# Altium footprint library ref-packages.PCBLIB: 1544 footprints (part 79 of 103)
Each footprint in its own frame and in the unit in brackets; x right, y up, seen from the top. Pads: shape width x height; smd on the part's side, far side on the other; paste and mask are expansions set on the pad; w line width, h text height; cw(c..) or ccw(c..) is an arc to the next point about the centre after c.
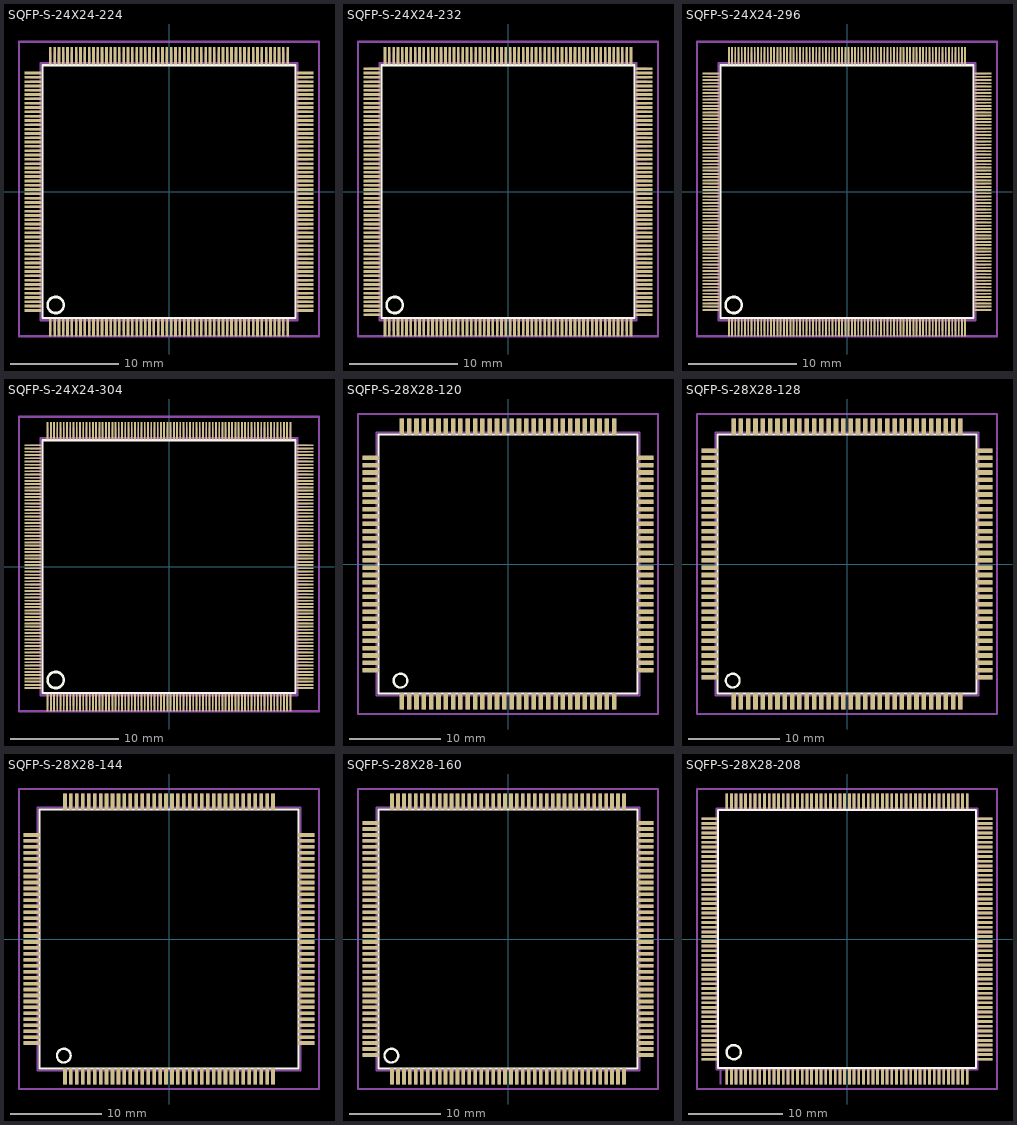
[diagram p78: the footprints below, top view; thin cyan lines are the x and y axes]

## SQFP-S-24X24-224 [mm]
pads (224):
  rect 0.25x1.6 smd: 1(-11,-12.6) 2(-10.6,-12.6) 3(-10.2,-12.6) 4(-9.8,-12.6) 5(-9.4,-12.6) 6(-9,-12.6) 7(-8.6,-12.6) 8(-8.2,-12.6) 9(-7.8,-12.6) 10(-7.4,-12.6) 11(-7,-12.6) 12(-6.6,-12.6) 13(-6.2,-12.6) 14(-5.8,-12.6) 15(-5.4,-12.6) 16(-5,-12.6) 17(-4.6,-12.6) 18(-4.2,-12.6) 19(-3.8,-12.6) 20(-3.4,-12.6) 21(-3,-12.6) 22(-2.6,-12.6) 23(-2.2,-12.6) 24(-1.8,-12.6) 25(-1.4,-12.6) 26(-1,-12.6) 27(-0.6,-12.6) 28(-0.2,-12.6) 29(0.2,-12.6) 30(0.6,-12.6) 31(1,-12.6) 32(1.4,-12.6) 33(1.8,-12.6) 34(2.2,-12.6) 35(2.6,-12.6) 36(3,-12.6) 37(3.4,-12.6) 38(3.8,-12.6) 39(4.2,-12.6) 40(4.6,-12.6) 41(5,-12.6) 42(5.4,-12.6) 43(5.8,-12.6) 44(6.2,-12.6) 45(6.6,-12.6) 46(7,-12.6) 47(7.4,-12.6) 48(7.8,-12.6) 49(8.2,-12.6) 50(8.6,-12.6) 51(9,-12.6) 52(9.4,-12.6) 53(9.8,-12.6) 54(10.2,-12.6) 55(10.6,-12.6) 56(11,-12.6) 113(11,12.6) 114(10.6,12.6) 115(10.2,12.6) 116(9.8,12.6) 117(9.4,12.6) 118(9,12.6) 119(8.6,12.6) 120(8.2,12.6) 121(7.8,12.6) 122(7.4,12.6) 123(7,12.6) 124(6.6,12.6) 125(6.2,12.6) 126(5.8,12.6) 127(5.4,12.6) 128(5,12.6) 129(4.6,12.6) 130(4.2,12.6) 131(3.8,12.6) 132(3.4,12.6) 133(3,12.6) 134(2.6,12.6) 135(2.2,12.6) 136(1.8,12.6) 137(1.4,12.6) 138(1,12.6) 139(0.6,12.6) 140(0.2,12.6) 141(-0.2,12.6) 142(-0.6,12.6) 143(-1,12.6) 144(-1.4,12.6) 145(-1.8,12.6) 146(-2.2,12.6) 147(-2.6,12.6) 148(-3,12.6) 149(-3.4,12.6) 150(-3.8,12.6) 151(-4.2,12.6) 152(-4.6,12.6) 153(-5,12.6) 154(-5.4,12.6) 155(-5.8,12.6) 156(-6.2,12.6) 157(-6.6,12.6) 158(-7,12.6) 159(-7.4,12.6) 160(-7.8,12.6) 161(-8.2,12.6) 162(-8.6,12.6) 163(-9,12.6) 164(-9.4,12.6) 165(-9.8,12.6) 166(-10.2,12.6) 167(-10.6,12.6) 168(-11,12.6)
  rect 1.6x0.25 smd: 57(12.6,-11) 58(12.6,-10.6) 59(12.6,-10.2) 60(12.6,-9.8) 61(12.6,-9.4) 62(12.6,-9) 63(12.6,-8.6) 64(12.6,-8.2) 65(12.6,-7.8) 66(12.6,-7.4) 67(12.6,-7) 68(12.6,-6.6) 69(12.6,-6.2) 70(12.6,-5.8) 71(12.6,-5.4) 72(12.6,-5) 73(12.6,-4.6) 74(12.6,-4.2) 75(12.6,-3.8) 76(12.6,-3.4) 77(12.6,-3) 78(12.6,-2.6) 79(12.6,-2.2) 80(12.6,-1.8) 81(12.6,-1.4) 82(12.6,-1) 83(12.6,-0.6) 84(12.6,-0.2) 85(12.6,0.2) 86(12.6,0.6) 87(12.6,1) 88(12.6,1.4) 89(12.6,1.8) 90(12.6,2.2) 91(12.6,2.6) 92(12.6,3) 93(12.6,3.4) 94(12.6,3.8) 95(12.6,4.2) 96(12.6,4.6) 97(12.6,5) 98(12.6,5.4) 99(12.6,5.8) 100(12.6,6.2) 101(12.6,6.6) 102(12.6,7) 103(12.6,7.4) 104(12.6,7.8) 105(12.6,8.2) 106(12.6,8.6) 107(12.6,9) 108(12.6,9.4) 109(12.6,9.8) 110(12.6,10.2) 111(12.6,10.6) 112(12.6,11) 169(-12.6,11) 170(-12.6,10.6) 171(-12.6,10.2) 172(-12.6,9.8) 173(-12.6,9.4) 174(-12.6,9) 175(-12.6,8.6) 176(-12.6,8.2) 177(-12.6,7.8) 178(-12.6,7.4) 179(-12.6,7) 180(-12.6,6.6) 181(-12.6,6.2) 182(-12.6,5.8) 183(-12.6,5.4) 184(-12.6,5) 185(-12.6,4.6) 186(-12.6,4.2) 187(-12.6,3.8) 188(-12.6,3.4) 189(-12.6,3) 190(-12.6,2.6) 191(-12.6,2.2) 192(-12.6,1.8) 193(-12.6,1.4) 194(-12.6,1) 195(-12.6,0.6) 196(-12.6,0.2) 197(-12.6,-0.2) 198(-12.6,-0.6) 199(-12.6,-1) 200(-12.6,-1.4) 201(-12.6,-1.8) 202(-12.6,-2.2) 203(-12.6,-2.6) 204(-12.6,-3) 205(-12.6,-3.4) 206(-12.6,-3.8) 207(-12.6,-4.2) 208(-12.6,-4.6) 209(-12.6,-5) 210(-12.6,-5.4) 211(-12.6,-5.8) 212(-12.6,-6.2) 213(-12.6,-6.6) 214(-12.6,-7) 215(-12.6,-7.4) 216(-12.6,-7.8) 217(-12.6,-8.2) 218(-12.6,-8.6) 219(-12.6,-9) 220(-12.6,-9.4) 221(-12.6,-9.8) 222(-12.6,-10.2) 223(-12.6,-10.6) 224(-12.6,-11)
Top Overlay:
  circle w0.254: c-10.5,-10.5 r0.75
  lines w0.203: -11.72,-11.71 11.71,-11.71 11.71,11.71 -11.72,11.71 -11.72,-11.71
Mechanical 16:
  drawing of 228 lines, arcs and shapes, not listed
Mechanical 27:
  lines w0.2: -13.9,-13.4 -13.9,13.9 13.9,13.9 13.9,-13.4 -13.9,-13.4

## SQFP-S-24X24-232 [mm]
pads (232):
  rect 0.25x1.6 smd: 1(-11.4,-12.6) 2(-11,-12.6) 3(-10.6,-12.6) 4(-10.2,-12.6) 5(-9.8,-12.6) 6(-9.4,-12.6) 7(-9,-12.6) 8(-8.6,-12.6) 9(-8.2,-12.6) 10(-7.8,-12.6) 11(-7.4,-12.6) 12(-7,-12.6) 13(-6.6,-12.6) 14(-6.2,-12.6) 15(-5.8,-12.6) 16(-5.4,-12.6) 17(-5,-12.6) 18(-4.6,-12.6) 19(-4.2,-12.6) 20(-3.8,-12.6) 21(-3.4,-12.6) 22(-3,-12.6) 23(-2.6,-12.6) 24(-2.2,-12.6) 25(-1.8,-12.6) 26(-1.4,-12.6) 27(-1,-12.6) 28(-0.6,-12.6) 29(-0.2,-12.6) 30(0.2,-12.6) 31(0.6,-12.6) 32(1,-12.6) 33(1.4,-12.6) 34(1.8,-12.6) 35(2.2,-12.6) 36(2.6,-12.6) 37(3,-12.6) 38(3.4,-12.6) 39(3.8,-12.6) 40(4.2,-12.6) 41(4.6,-12.6) 42(5,-12.6) 43(5.4,-12.6) 44(5.8,-12.6) 45(6.2,-12.6) 46(6.6,-12.6) 47(7,-12.6) 48(7.4,-12.6) 49(7.8,-12.6) 50(8.2,-12.6) 51(8.6,-12.6) 52(9,-12.6) 53(9.4,-12.6) 54(9.8,-12.6) 55(10.2,-12.6) 56(10.6,-12.6) 57(11,-12.6) 58(11.4,-12.6) 117(11.4,12.6) 118(11,12.6) 119(10.6,12.6) 120(10.2,12.6) 121(9.8,12.6) 122(9.4,12.6) 123(9,12.6) 124(8.6,12.6) 125(8.2,12.6) 126(7.8,12.6) 127(7.4,12.6) 128(7,12.6) 129(6.6,12.6) 130(6.2,12.6) 131(5.8,12.6) 132(5.4,12.6) 133(5,12.6) 134(4.6,12.6) 135(4.2,12.6) 136(3.8,12.6) 137(3.4,12.6) 138(3,12.6) 139(2.6,12.6) 140(2.2,12.6) 141(1.8,12.6) 142(1.4,12.6) 143(1,12.6) 144(0.6,12.6) 145(0.2,12.6) 146(-0.2,12.6) 147(-0.6,12.6) 148(-1,12.6) 149(-1.4,12.6) 150(-1.8,12.6) 151(-2.2,12.6) 152(-2.6,12.6) 153(-3,12.6) 154(-3.4,12.6) 155(-3.8,12.6) 156(-4.2,12.6) 157(-4.6,12.6) 158(-5,12.6) 159(-5.4,12.6) 160(-5.8,12.6) 161(-6.2,12.6) 162(-6.6,12.6) 163(-7,12.6) 164(-7.4,12.6) 165(-7.8,12.6) 166(-8.2,12.6) 167(-8.6,12.6) 168(-9,12.6) 169(-9.4,12.6) 170(-9.8,12.6) 171(-10.2,12.6) 172(-10.6,12.6) 173(-11,12.6) 174(-11.4,12.6)
  rect 1.6x0.25 smd: 59(12.6,-11.4) 60(12.6,-11) 61(12.6,-10.6) 62(12.6,-10.2) 63(12.6,-9.8) 64(12.6,-9.4) 65(12.6,-9) 66(12.6,-8.6) 67(12.6,-8.2) 68(12.6,-7.8) 69(12.6,-7.4) 70(12.6,-7) 71(12.6,-6.6) 72(12.6,-6.2) 73(12.6,-5.8) 74(12.6,-5.4) 75(12.6,-5) 76(12.6,-4.6) 77(12.6,-4.2) 78(12.6,-3.8) 79(12.6,-3.4) 80(12.6,-3) 81(12.6,-2.6) 82(12.6,-2.2) 83(12.6,-1.8) 84(12.6,-1.4) 85(12.6,-1) 86(12.6,-0.6) 87(12.6,-0.2) 88(12.6,0.2) 89(12.6,0.6) 90(12.6,1) 91(12.6,1.4) 92(12.6,1.8) 93(12.6,2.2) 94(12.6,2.6) 95(12.6,3) 96(12.6,3.4) 97(12.6,3.8) 98(12.6,4.2) 99(12.6,4.6) 100(12.6,5) 101(12.6,5.4) 102(12.6,5.8) 103(12.6,6.2) 104(12.6,6.6) 105(12.6,7) 106(12.6,7.4) 107(12.6,7.8) 108(12.6,8.2) 109(12.6,8.6) 110(12.6,9) 111(12.6,9.4) 112(12.6,9.8) 113(12.6,10.2) 114(12.6,10.6) 115(12.6,11) 116(12.6,11.4) 175(-12.6,11.4) 176(-12.6,11) 177(-12.6,10.6) 178(-12.6,10.2) 179(-12.6,9.8) 180(-12.6,9.4) 181(-12.6,9) 182(-12.6,8.6) 183(-12.6,8.2) 184(-12.6,7.8) 185(-12.6,7.4) 186(-12.6,7) 187(-12.6,6.6) 188(-12.6,6.2) 189(-12.6,5.8) 190(-12.6,5.4) 191(-12.6,5) 192(-12.6,4.6) 193(-12.6,4.2) 194(-12.6,3.8) 195(-12.6,3.4) 196(-12.6,3) 197(-12.6,2.6) 198(-12.6,2.2) 199(-12.6,1.8) 200(-12.6,1.4) 201(-12.6,1) 202(-12.6,0.6) 203(-12.6,0.2) 204(-12.6,-0.2) 205(-12.6,-0.6) 206(-12.6,-1) 207(-12.6,-1.4) 208(-12.6,-1.8) 209(-12.6,-2.2) 210(-12.6,-2.6) 211(-12.6,-3) 212(-12.6,-3.4) 213(-12.6,-3.8) 214(-12.6,-4.2) 215(-12.6,-4.6) 216(-12.6,-5) 217(-12.6,-5.4) 218(-12.6,-5.8) 219(-12.6,-6.2) 220(-12.6,-6.6) 221(-12.6,-7) 222(-12.6,-7.4) 223(-12.6,-7.8) 224(-12.6,-8.2) 225(-12.6,-8.6) 226(-12.6,-9) 227(-12.6,-9.4) 228(-12.6,-9.8) 229(-12.6,-10.2) 230(-12.6,-10.6) 231(-12.6,-11) 232(-12.6,-11.4)
Top Overlay:
  circle w0.254: c-10.5,-10.5 r0.75
  lines w0.203: -11.72,-11.71 11.71,-11.71 11.71,11.71 -11.72,11.71 -11.72,-11.71
Mechanical 16:
  drawing of 236 lines, arcs and shapes, not listed
Mechanical 27:
  lines w0.2: -13.9,-13.4 -13.9,13.9 13.9,13.9 13.9,-13.4 -13.9,-13.4

## SQFP-S-24X24-296 [mm]
pads (296):
  rect 0.17x1.6 smd: 1(-10.95,-12.6) 2(-10.65,-12.6) 3(-10.35,-12.6) 4(-10.05,-12.6) 5(-9.75,-12.6) 6(-9.45,-12.6) 7(-9.15,-12.6) 8(-8.85,-12.6) 9(-8.55,-12.6) 10(-8.25,-12.6) 11(-7.95,-12.6) 12(-7.65,-12.6) 13(-7.35,-12.6) 14(-7.05,-12.6) 15(-6.75,-12.6) 16(-6.45,-12.6) 17(-6.15,-12.6) 18(-5.85,-12.6) 19(-5.55,-12.6) 20(-5.25,-12.6) 21(-4.95,-12.6) 22(-4.65,-12.6) 23(-4.35,-12.6) 24(-4.05,-12.6) 25(-3.75,-12.6) 26(-3.45,-12.6) 27(-3.15,-12.6) 28(-2.85,-12.6) 29(-2.55,-12.6) 30(-2.25,-12.6) 31(-1.95,-12.6) 32(-1.65,-12.6) 33(-1.35,-12.6) 34(-1.05,-12.6) 35(-0.75,-12.6) 36(-0.45,-12.6) 37(-0.15,-12.6) 38(0.15,-12.6) 39(0.45,-12.6) 40(0.75,-12.6) 41(1.05,-12.6) 42(1.35,-12.6) 43(1.65,-12.6) 44(1.95,-12.6) 45(2.25,-12.6) 46(2.55,-12.6) 47(2.85,-12.6) 48(3.15,-12.6) 49(3.45,-12.6) 50(3.75,-12.6) 51(4.05,-12.6) 52(4.35,-12.6) 53(4.65,-12.6) 54(4.95,-12.6) 55(5.25,-12.6) 56(5.55,-12.6) 57(5.85,-12.6) 58(6.15,-12.6) 59(6.45,-12.6) 60(6.75,-12.6) 61(7.05,-12.6) 62(7.35,-12.6) 63(7.65,-12.6) 64(7.95,-12.6) 65(8.25,-12.6) 66(8.55,-12.6) 67(8.85,-12.6) 68(9.15,-12.6) 69(9.45,-12.6) 70(9.75,-12.6) 71(10.05,-12.6) 72(10.35,-12.6) 73(10.65,-12.6) 74(10.95,-12.6) 149(10.95,12.6) 150(10.65,12.6) 151(10.35,12.6) 152(10.05,12.6) 153(9.75,12.6) 154(9.45,12.6) 155(9.15,12.6) 156(8.85,12.6) 157(8.55,12.6) 158(8.25,12.6) 159(7.95,12.6) 160(7.65,12.6) 161(7.35,12.6) 162(7.05,12.6) 163(6.75,12.6) 164(6.45,12.6) 165(6.15,12.6) 166(5.85,12.6) 167(5.55,12.6) 168(5.25,12.6) 169(4.95,12.6) 170(4.65,12.6) 171(4.35,12.6) 172(4.05,12.6) 173(3.75,12.6) 174(3.45,12.6) 175(3.15,12.6) 176(2.85,12.6) 177(2.55,12.6) 178(2.25,12.6) 179(1.95,12.6) 180(1.65,12.6) 181(1.35,12.6) 182(1.05,12.6) 183(0.75,12.6) 184(0.45,12.6) 185(0.15,12.6) 186(-0.15,12.6) 187(-0.45,12.6) 188(-0.75,12.6) 189(-1.05,12.6) 190(-1.35,12.6) 191(-1.65,12.6) 192(-1.95,12.6) 193(-2.25,12.6) 194(-2.55,12.6) 195(-2.85,12.6) 196(-3.15,12.6) 197(-3.45,12.6) 198(-3.75,12.6) 199(-4.05,12.6) 200(-4.35,12.6) 201(-4.65,12.6) 202(-4.95,12.6) 203(-5.25,12.6) 204(-5.55,12.6) 205(-5.85,12.6) 206(-6.15,12.6) 207(-6.45,12.6) 208(-6.75,12.6) 209(-7.05,12.6) 210(-7.35,12.6) 211(-7.65,12.6) 212(-7.95,12.6) 213(-8.25,12.6) 214(-8.55,12.6) 215(-8.85,12.6) 216(-9.15,12.6) 217(-9.45,12.6) 218(-9.75,12.6) 219(-10.05,12.6) 220(-10.35,12.6) 221(-10.65,12.6) 222(-10.95,12.6)
  rect 1.6x0.17 smd: 75(12.6,-10.95) 76(12.6,-10.65) 77(12.6,-10.35) 78(12.6,-10.05) 79(12.6,-9.75) 80(12.6,-9.45) 81(12.6,-9.15) 82(12.6,-8.85) 83(12.6,-8.55) 84(12.6,-8.25) 85(12.6,-7.95) 86(12.6,-7.65) 87(12.6,-7.35) 88(12.6,-7.05) 89(12.6,-6.75) 90(12.6,-6.45) 91(12.6,-6.15) 92(12.6,-5.85) 93(12.6,-5.55) 94(12.6,-5.25) 95(12.6,-4.95) 96(12.6,-4.65) 97(12.6,-4.35) 98(12.6,-4.05) 99(12.6,-3.75) 100(12.6,-3.45) 101(12.6,-3.15) 102(12.6,-2.85) 103(12.6,-2.55) 104(12.6,-2.25) 105(12.6,-1.95) 106(12.6,-1.65) 107(12.6,-1.35) 108(12.6,-1.05) 109(12.6,-0.75) 110(12.6,-0.45) 111(12.6,-0.15) 112(12.6,0.15) 113(12.6,0.45) 114(12.6,0.75) 115(12.6,1.05) 116(12.6,1.35) 117(12.6,1.65) 118(12.6,1.95) 119(12.6,2.25) 120(12.6,2.55) 121(12.6,2.85) 122(12.6,3.15) 123(12.6,3.45) 124(12.6,3.75) 125(12.6,4.05) 126(12.6,4.35) 127(12.6,4.65) 128(12.6,4.95) 129(12.6,5.25) 130(12.6,5.55) 131(12.6,5.85) 132(12.6,6.15) 133(12.6,6.45) 134(12.6,6.75) 135(12.6,7.05) 136(12.6,7.35) 137(12.6,7.65) 138(12.6,7.95) 139(12.6,8.25) 140(12.6,8.55) 141(12.6,8.85) 142(12.6,9.15) 143(12.6,9.45) 144(12.6,9.75) 145(12.6,10.05) 146(12.6,10.35) 147(12.6,10.65) 148(12.6,10.95) 223(-12.6,10.95) 224(-12.6,10.65) 225(-12.6,10.35) 226(-12.6,10.05) 227(-12.6,9.75) 228(-12.6,9.45) 229(-12.6,9.15) 230(-12.6,8.85) 231(-12.6,8.55) 232(-12.6,8.25) 233(-12.6,7.95) 234(-12.6,7.65) 235(-12.6,7.35) 236(-12.6,7.05) 237(-12.6,6.75) 238(-12.6,6.45) 239(-12.6,6.15) 240(-12.6,5.85) 241(-12.6,5.55) 242(-12.6,5.25) 243(-12.6,4.95) 244(-12.6,4.65) 245(-12.6,4.35) 246(-12.6,4.05) 247(-12.6,3.75) 248(-12.6,3.45) 249(-12.6,3.15) 250(-12.6,2.85) 251(-12.6,2.55) 252(-12.6,2.25) 253(-12.6,1.95) 254(-12.6,1.65) 255(-12.6,1.35) 256(-12.6,1.05) 257(-12.6,0.75) 258(-12.6,0.45) 259(-12.6,0.15) 260(-12.6,-0.15) 261(-12.6,-0.45) 262(-12.6,-0.75) 263(-12.6,-1.05) 264(-12.6,-1.35) 265(-12.6,-1.65) 266(-12.6,-1.95) 267(-12.6,-2.25) 268(-12.6,-2.55) 269(-12.6,-2.85) 270(-12.6,-3.15) 271(-12.6,-3.45) 272(-12.6,-3.75) 273(-12.6,-4.05) 274(-12.6,-4.35) 275(-12.6,-4.65) 276(-12.6,-4.95) 277(-12.6,-5.25) 278(-12.6,-5.55) 279(-12.6,-5.85) 280(-12.6,-6.15) 281(-12.6,-6.45) 282(-12.6,-6.75) 283(-12.6,-7.05) 284(-12.6,-7.35) 285(-12.6,-7.65) 286(-12.6,-7.95) 287(-12.6,-8.25) 288(-12.6,-8.55) 289(-12.6,-8.85) 290(-12.6,-9.15) 291(-12.6,-9.45) 292(-12.6,-9.75) 293(-12.6,-10.05) 294(-12.6,-10.35) 295(-12.6,-10.65) 296(-12.6,-10.95)
Top Overlay:
  circle w0.254: c-10.5,-10.5 r0.75
  lines w0.203: -11.72,-11.71 11.71,-11.71 11.71,11.71 -11.72,11.71 -11.72,-11.71
Mechanical 16:
  drawing of 300 lines, arcs and shapes, not listed
Mechanical 27:
  lines w0.2: -13.9,-13.4 -13.9,13.9 13.9,13.9 13.9,-13.4 -13.9,-13.4

## SQFP-S-24X24-304 [mm]
pads (304):
  rect 0.17x1.6 smd: 1(-11.25,-12.6) 2(-10.95,-12.6) 3(-10.65,-12.6) 4(-10.35,-12.6) 5(-10.05,-12.6) 6(-9.75,-12.6) 7(-9.45,-12.6) 8(-9.15,-12.6) 9(-8.85,-12.6) 10(-8.55,-12.6) 11(-8.25,-12.6) 12(-7.95,-12.6) 13(-7.65,-12.6) 14(-7.35,-12.6) 15(-7.05,-12.6) 16(-6.75,-12.6) 17(-6.45,-12.6) 18(-6.15,-12.6) 19(-5.85,-12.6) 20(-5.55,-12.6) 21(-5.25,-12.6) 22(-4.95,-12.6) 23(-4.65,-12.6) 24(-4.35,-12.6) 25(-4.05,-12.6) 26(-3.75,-12.6) 27(-3.45,-12.6) 28(-3.15,-12.6) 29(-2.85,-12.6) 30(-2.55,-12.6) 31(-2.25,-12.6) 32(-1.95,-12.6) 33(-1.65,-12.6) 34(-1.35,-12.6) 35(-1.05,-12.6) 36(-0.75,-12.6) 37(-0.45,-12.6) 38(-0.15,-12.6) 39(0.15,-12.6) 40(0.45,-12.6) 41(0.75,-12.6) 42(1.05,-12.6) 43(1.35,-12.6) 44(1.65,-12.6) 45(1.95,-12.6) 46(2.25,-12.6) 47(2.55,-12.6) 48(2.85,-12.6) 49(3.15,-12.6) 50(3.45,-12.6) 51(3.75,-12.6) 52(4.05,-12.6) 53(4.35,-12.6) 54(4.65,-12.6) 55(4.95,-12.6) 56(5.25,-12.6) 57(5.55,-12.6) 58(5.85,-12.6) 59(6.15,-12.6) 60(6.45,-12.6) 61(6.75,-12.6) 62(7.05,-12.6) 63(7.35,-12.6) 64(7.65,-12.6) 65(7.95,-12.6) 66(8.25,-12.6) 67(8.55,-12.6) 68(8.85,-12.6) 69(9.15,-12.6) 70(9.45,-12.6) 71(9.75,-12.6) 72(10.05,-12.6) 73(10.35,-12.6) 74(10.65,-12.6) 75(10.95,-12.6) 76(11.25,-12.6) 153(11.25,12.6) 154(10.95,12.6) 155(10.65,12.6) 156(10.35,12.6) 157(10.05,12.6) 158(9.75,12.6) 159(9.45,12.6) 160(9.15,12.6) 161(8.85,12.6) 162(8.55,12.6) 163(8.25,12.6) 164(7.95,12.6) 165(7.65,12.6) 166(7.35,12.6) 167(7.05,12.6) 168(6.75,12.6) 169(6.45,12.6) 170(6.15,12.6) 171(5.85,12.6) 172(5.55,12.6) 173(5.25,12.6) 174(4.95,12.6) 175(4.65,12.6) 176(4.35,12.6) 177(4.05,12.6) 178(3.75,12.6) 179(3.45,12.6) 180(3.15,12.6) 181(2.85,12.6) 182(2.55,12.6) 183(2.25,12.6) 184(1.95,12.6) 185(1.65,12.6) 186(1.35,12.6) 187(1.05,12.6) 188(0.75,12.6) 189(0.45,12.6) 190(0.15,12.6) 191(-0.15,12.6) 192(-0.45,12.6) 193(-0.75,12.6) 194(-1.05,12.6) 195(-1.35,12.6) 196(-1.65,12.6) 197(-1.95,12.6) 198(-2.25,12.6) 199(-2.55,12.6) 200(-2.85,12.6) 201(-3.15,12.6) 202(-3.45,12.6) 203(-3.75,12.6) 204(-4.05,12.6) 205(-4.35,12.6) 206(-4.65,12.6) 207(-4.95,12.6) 208(-5.25,12.6) 209(-5.55,12.6) 210(-5.85,12.6) 211(-6.15,12.6) 212(-6.45,12.6) 213(-6.75,12.6) 214(-7.05,12.6) 215(-7.35,12.6) 216(-7.65,12.6) 217(-7.95,12.6) 218(-8.25,12.6) 219(-8.55,12.6) 220(-8.85,12.6) 221(-9.15,12.6) 222(-9.45,12.6) 223(-9.75,12.6) 224(-10.05,12.6) 225(-10.35,12.6) 226(-10.65,12.6) 227(-10.95,12.6) 228(-11.25,12.6)
  rect 1.6x0.17 smd: 77(12.6,-11.25) 78(12.6,-10.95) 79(12.6,-10.65) 80(12.6,-10.35) 81(12.6,-10.05) 82(12.6,-9.75) 83(12.6,-9.45) 84(12.6,-9.15) 85(12.6,-8.85) 86(12.6,-8.55) 87(12.6,-8.25) 88(12.6,-7.95) 89(12.6,-7.65) 90(12.6,-7.35) 91(12.6,-7.05) 92(12.6,-6.75) 93(12.6,-6.45) 94(12.6,-6.15) 95(12.6,-5.85) 96(12.6,-5.55) 97(12.6,-5.25) 98(12.6,-4.95) 99(12.6,-4.65) 100(12.6,-4.35) 101(12.6,-4.05) 102(12.6,-3.75) 103(12.6,-3.45) 104(12.6,-3.15) 105(12.6,-2.85) 106(12.6,-2.55) 107(12.6,-2.25) 108(12.6,-1.95) 109(12.6,-1.65) 110(12.6,-1.35) 111(12.6,-1.05) 112(12.6,-0.75) 113(12.6,-0.45) 114(12.6,-0.15) 115(12.6,0.15) 116(12.6,0.45) 117(12.6,0.75) 118(12.6,1.05) 119(12.6,1.35) 120(12.6,1.65) 121(12.6,1.95) 122(12.6,2.25) 123(12.6,2.55) 124(12.6,2.85) 125(12.6,3.15) 126(12.6,3.45) 127(12.6,3.75) 128(12.6,4.05) 129(12.6,4.35) 130(12.6,4.65) 131(12.6,4.95) 132(12.6,5.25) 133(12.6,5.55) 134(12.6,5.85) 135(12.6,6.15) 136(12.6,6.45) 137(12.6,6.75) 138(12.6,7.05) 139(12.6,7.35) 140(12.6,7.65) 141(12.6,7.95) 142(12.6,8.25) 143(12.6,8.55) 144(12.6,8.85) 145(12.6,9.15) 146(12.6,9.45) 147(12.6,9.75) 148(12.6,10.05) 149(12.6,10.35) 150(12.6,10.65) 151(12.6,10.95) 152(12.6,11.25) 229(-12.6,11.25) 230(-12.6,10.95) 231(-12.6,10.65) 232(-12.6,10.35) 233(-12.6,10.05) 234(-12.6,9.75) 235(-12.6,9.45) 236(-12.6,9.15) 237(-12.6,8.85) 238(-12.6,8.55) 239(-12.6,8.25) 240(-12.6,7.95) 241(-12.6,7.65) 242(-12.6,7.35) 243(-12.6,7.05) 244(-12.6,6.75) 245(-12.6,6.45) 246(-12.6,6.15) 247(-12.6,5.85) 248(-12.6,5.55) 249(-12.6,5.25) 250(-12.6,4.95) 251(-12.6,4.65) 252(-12.6,4.35) 253(-12.6,4.05) 254(-12.6,3.75) 255(-12.6,3.45) 256(-12.6,3.15) 257(-12.6,2.85) 258(-12.6,2.55) 259(-12.6,2.25) 260(-12.6,1.95) 261(-12.6,1.65) 262(-12.6,1.35) 263(-12.6,1.05) 264(-12.6,0.75) 265(-12.6,0.45) 266(-12.6,0.15) 267(-12.6,-0.15) 268(-12.6,-0.45) 269(-12.6,-0.75) 270(-12.6,-1.05) 271(-12.6,-1.35) 272(-12.6,-1.65) 273(-12.6,-1.95) 274(-12.6,-2.25) 275(-12.6,-2.55) 276(-12.6,-2.85) 277(-12.6,-3.15) 278(-12.6,-3.45) 279(-12.6,-3.75) 280(-12.6,-4.05) 281(-12.6,-4.35) 282(-12.6,-4.65) 283(-12.6,-4.95) 284(-12.6,-5.25) 285(-12.6,-5.55) 286(-12.6,-5.85) 287(-12.6,-6.15) 288(-12.6,-6.45) 289(-12.6,-6.75) 290(-12.6,-7.05) 291(-12.6,-7.35) 292(-12.6,-7.65) 293(-12.6,-7.95) 294(-12.6,-8.25) 295(-12.6,-8.55) 296(-12.6,-8.85) 297(-12.6,-9.15) 298(-12.6,-9.45) 299(-12.6,-9.75) 300(-12.6,-10.05) 301(-12.6,-10.35) 302(-12.6,-10.65) 303(-12.6,-10.95) 304(-12.6,-11.25)
Top Overlay:
  circle w0.254: c-10.5,-10.5 r0.75
  lines w0.203: -11.72,-11.71 11.71,-11.71 11.71,11.71 -11.72,11.71 -11.72,-11.71
Mechanical 16:
  drawing of 308 lines, arcs and shapes, not listed
Mechanical 27:
  lines w0.2: -13.9,-13.4 -13.9,13.9 13.9,13.9 13.9,-13.4 -13.9,-13.4

## SQFP-S-28X28-120 [mm]
pads (120):
  rect 0.5x1.8 smd: 1(-11.6,-15) 2(-10.8,-15) 3(-10,-15) 4(-9.2,-15) 5(-8.4,-15) 6(-7.6,-15) 7(-6.8,-15) 8(-6,-15) 9(-5.2,-15) 10(-4.4,-15) 11(-3.6,-15) 12(-2.8,-15) 13(-2,-15) 14(-1.2,-15) 15(-0.4,-15) 16(0.4,-15) 17(1.2,-15) 18(2,-15) 19(2.8,-15) 20(3.6,-15) 21(4.4,-15) 22(5.2,-15) 23(6,-15) 24(6.8,-15) 25(7.6,-15) 26(8.4,-15) 27(9.2,-15) 28(10,-15) 29(10.8,-15) 30(11.6,-15) 61(11.6,15) 62(10.8,15) 63(10,15) 64(9.2,15) 65(8.4,15) 66(7.6,15) 67(6.8,15) 68(6,15) 69(5.2,15) 70(4.4,15) 71(3.6,15) 72(2.8,15) 73(2,15) 74(1.2,15) 75(0.4,15) 76(-0.4,15) 77(-1.2,15) 78(-2,15) 79(-2.8,15) 80(-3.6,15) 81(-4.4,15) 82(-5.2,15) 83(-6,15) 84(-6.8,15) 85(-7.6,15) 86(-8.4,15) 87(-9.2,15) 88(-10,15) 89(-10.8,15) 90(-11.6,15)
  rect 1.8x0.5 smd: 31(15,-11.6) 32(15,-10.8) 33(15,-10) 34(15,-9.2) 35(15,-8.4) 36(15,-7.6) 37(15,-6.8) 38(15,-6) 39(15,-5.2) 40(15,-4.4) 41(15,-3.6) 42(15,-2.8) 43(15,-2) 44(15,-1.2) 45(15,-0.4) 46(15,0.4) 47(15,1.2) 48(15,2) 49(15,2.8) 50(15,3.6) 51(15,4.4) 52(15,5.2) 53(15,6) 54(15,6.8) 55(15,7.6) 56(15,8.4) 57(15,9.2) 58(15,10) 59(15,10.8) 60(15,11.6) 91(-15,11.6) 92(-15,10.8) 93(-15,10) 94(-15,9.2) 95(-15,8.4) 96(-15,7.6) 97(-15,6.8) 98(-15,6) 99(-15,5.2) 100(-15,4.4) 101(-15,3.6) 102(-15,2.8) 103(-15,2) 104(-15,1.2) 105(-15,0.4) 106(-15,-0.4) 107(-15,-1.2) 108(-15,-2) 109(-15,-2.8) 110(-15,-3.6) 111(-15,-4.4) 112(-15,-5.2) 113(-15,-6) 114(-15,-6.8) 115(-15,-7.6) 116(-15,-8.4) 117(-15,-9.2) 118(-15,-10) 119(-15,-10.8) 120(-15,-11.6)
Top Overlay:
  circle w0.254: c-11.75,-12.75 r0.75
  lines w0.203: -14.17,-14.16 14.16,-14.16 14.16,14.16 -14.17,14.16 -14.17,-14.16
Mechanical 16:
  rectangle: -11.82,-15.9 -11.38,-14.45
  rectangle: -11.02,-15.9 -10.58,-14.45
  rectangle: -10.22,-15.9 -9.78,-14.45
  rectangle: -9.42,-15.9 -8.98,-14.45
  rectangle: -8.62,-15.9 -8.18,-14.45
  rectangle: -7.82,-15.9 -7.38,-14.45
  rectangle: -7.02,-15.9 -6.58,-14.45
  rectangle: -6.22,-15.9 -5.78,-14.45
  rectangle: -5.42,-15.9 -4.98,-14.45
  rectangle: -4.62,-15.9 -4.18,-14.45
  rectangle: -3.82,-15.9 -3.38,-14.45
  rectangle: -3.02,-15.9 -2.58,-14.45
  rectangle: -2.22,-15.9 -1.78,-14.45
  rectangle: -1.42,-15.9 -0.98,-14.45
  rectangle: -0.62,-15.9 -0.18,-14.45
  rectangle: 0.18,-15.9 0.62,-14.45
  rectangle: 0.98,-15.9 1.42,-14.45
  rectangle: 1.78,-15.9 2.22,-14.45
  rectangle: 2.58,-15.9 3.02,-14.45
  rectangle: 3.38,-15.9 3.82,-14.45
  rectangle: 4.18,-15.9 4.62,-14.45
  rectangle: 4.98,-15.9 5.42,-14.45
  rectangle: 5.78,-15.9 6.22,-14.45
  rectangle: 6.58,-15.9 7.02,-14.45
  rectangle: 7.38,-15.9 7.82,-14.45
  rectangle: 8.18,-15.9 8.62,-14.45
  rectangle: 8.98,-15.9 9.42,-14.45
  rectangle: 9.78,-15.9 10.22,-14.45
  rectangle: 10.58,-15.9 11.02,-14.45
  rectangle: 11.38,-15.9 11.82,-14.45
  rectangle: 14.45,-11.82 15.9,-11.38
  rectangle: 14.45,-11.02 15.9,-10.58
  rectangle: 14.45,-10.22 15.9,-9.78
  rectangle: 14.45,-9.42 15.9,-8.98
  rectangle: 14.45,-8.62 15.9,-8.18
  rectangle: 14.45,-7.82 15.9,-7.38
  rectangle: 14.45,-7.02 15.9,-6.58
  rectangle: 14.45,-6.22 15.9,-5.78
  rectangle: 14.45,-5.42 15.9,-4.98
  rectangle: 14.45,-4.62 15.9,-4.18
  rectangle: 14.45,-3.82 15.9,-3.38
  rectangle: 14.45,-3.02 15.9,-2.58
  rectangle: 14.45,-2.22 15.9,-1.78
  rectangle: 14.45,-1.42 15.9,-0.98
  rectangle: 14.45,-0.62 15.9,-0.18
  rectangle: 14.45,0.18 15.9,0.62
  rectangle: 14.45,0.98 15.9,1.42
  rectangle: 14.45,1.78 15.9,2.22
  rectangle: 14.45,2.58 15.9,3.02
  rectangle: 14.45,3.38 15.9,3.82
  rectangle: 14.45,4.18 15.9,4.62
  rectangle: 14.45,4.98 15.9,5.42
  rectangle: 14.45,5.78 15.9,6.22
  rectangle: 14.45,6.58 15.9,7.02
  rectangle: 14.45,7.38 15.9,7.82
  rectangle: 14.45,8.18 15.9,8.62
  rectangle: 14.45,8.98 15.9,9.42
  rectangle: 14.45,9.78 15.9,10.22
  rectangle: 14.45,10.58 15.9,11.02
  rectangle: 14.45,11.38 15.9,11.82